# Altium footprint library TYCO THD.PcbLib: 146 footprints (part 3 of 11) (continued)
## TYCO_2-1761606-5 [mm] "14 Contacts, Vertical Low Profile IDC Shrouded Header, with Long Eject Latch" (continued)
Mechanical 14:
  lines w0.1: -11.328,-4.191 -11.379,-4.191 -11.379,-4.369 -12.7,-4.369 -12.7,4.826 -11.379,4.826 -11.379,4.369 11.379,4.369 11.379,4.826 12.7,4.826 12.7,-4.369 11.379,-4.369 11.379,-4.191 11.328,-4.191 ; -11.328,-3.581 -11.76,-3.581 ; -11.328,-3.2 -11.379,-3.2 ; -11.328,0.33 -9.881,0.33 -9.881,-5.588 ; -9.881,-4.191 -8.636,-4.191 -8.636,-4.369 4.204,-4.369 4.204,-3.886 8.496,-3.886 8.496,-4.369 8.636,-4.369 8.636,-4.191 9.881,-4.191 ; -9.881,-3.581 -2.921,-3.581 ; -9.881,-3.2 9.881,-3.2 ; -8.687,-4.191 -8.687,-5.588 -11.328,-5.588 -11.328,3.226 -8.687,3.226 -8.687,-3.2 ; -8.636,-3.2 -8.636,3.81 -11.76,3.81 ; -8.636,3.2 8.636,3.2 ; -8.636,3.429 -11.379,3.429 ; -8.636,3.581 8.636,3.581 ; -7.874,-4.369 -7.874,-4.191 -6.35,-4.191 -6.35,-4.369 ; -2.921,-4.369 -2.921,-3.581 ; -2.54,-4.369 -2.54,-3.2 -2.921,-3.581 ; 2.54,-4.369 2.54,-3.2 2.921,-3.581 ; 2.921,-4.369 2.921,-3.581 ; 5.156,-3.886 5.156,-3.2 ; 5.156,-3.581 2.921,-3.581 ; 5.156,-3.454 7.264,-3.454 ; 7.264,-3.886 7.264,-3.2 ; 7.264,-3.581 9.881,-3.581 ; 8.636,-3.2 8.636,3.81 11.76,3.81 ; 8.636,3.429 11.379,3.429 ; 8.687,-4.191 8.687,-5.588 11.328,-5.588 11.328,3.226 8.687,3.226 8.687,-3.2 ; 9.881,-5.588 9.881,0.33 11.328,0.33 ; 11.328,-3.581 11.76,-3.581 ; 11.328,-3.2 11.379,-3.2 ; -11.76,-3.581 -11.379,-3.2 ; -11.76,-3.581 -11.76,3.81 ; -11.76,3.81 -11.379,3.429 ; -11.379,-3.2 -11.379,3.429 ; 11.379,-3.2 11.379,3.429 ; 11.379,-3.2 11.76,-3.581 ; 11.379,3.429 11.76,3.81 ; 11.76,-3.581 11.76,3.81 ; -7.938,-1.587 -7.938,-0.953 -7.302,-0.953 -7.302,-1.587 -7.938,-1.587 ; -7.938,0.953 -7.302,0.953 -7.302,1.587 -7.938,1.587 -7.938,0.953 ; -5.397,-1.587 -5.397,-0.953 -4.763,-0.953 -4.763,-1.587 -5.397,-1.587 ; -5.397,0.953 -4.763,0.953 -4.763,1.587 -5.397,1.587 -5.397,0.953 ; -2.857,-1.587 -2.857,-0.953 -2.222,-0.953 -2.222,-1.587 -2.857,-1.587 ; -2.857,0.953 -2.222,0.953 -2.222,1.587 -2.857,1.587 -2.857,0.953 ; -0.318,-1.587 -0.318,-0.953 0.318,-0.953 0.318,-1.587 -0.318,-1.587 ; -0.318,0.953 0.318,0.953 0.318,1.587 -0.318,1.587 -0.318,0.953 ; 2.222,-1.587 2.222,-0.953 2.857,-0.953 2.857,-1.587 2.222,-1.587 ; 2.222,0.953 2.857,0.953 2.857,1.587 2.222,1.587 2.222,0.953 ; 4.763,-1.587 4.763,-0.953 5.397,-0.953 5.397,-1.587 4.763,-1.587 ; 4.763,0.953 5.397,0.953 5.397,1.587 4.763,1.587 4.763,0.953 ; 7.302,-1.587 7.302,-0.953 7.938,-0.953 7.938,-1.587 7.302,-1.587 ; 7.302,0.953 7.938,0.953 7.938,1.587 7.302,1.587 7.302,0.953
3D body "TYCO_2-1761606-5.stp": height 22.55, standoff -2.59, extent -12.7,-5.588 12.7,4.826

## TYCO_2-1761606-6 [mm] "16 Contacts, Vertical Low Profile IDC Shrouded Header, with Long Eject Latch"
height 22.86
pads (16):
  round 1.6 hole 0.9: 1(-8.89,-1.27) 2(-8.89,1.27) 3(-6.35,-1.27) 4(-6.35,1.27) 5(-3.81,-1.27) 6(-3.81,1.27) 7(-1.27,-1.27) 8(-1.27,1.27) 9(1.27,-1.27) 10(1.27,1.27) 11(3.81,-1.27) 12(3.81,1.27) 13(6.35,-1.27) 14(6.35,1.27) 15(8.89,-1.27) 16(8.89,1.27)
Top Overlay:
  circle w0.3: c-7.62,-5.08 r0.15
  lines w0.2: -12.598,-4.191 -12.649,-4.191 -12.649,-4.369 -13.97,-4.369 -13.97,4.826 -12.649,4.826 -12.649,4.369 12.649,4.369 12.649,4.826 13.97,4.826 13.97,-4.369 12.649,-4.369 12.649,-4.191 12.598,-4.191 ; -12.598,-3.581 -13.03,-3.581 ; -12.598,-3.2 -12.649,-3.2 ; -12.598,0.33 -11.151,0.33 -11.151,-5.588 ; -11.151,-4.191 -9.906,-4.191 -9.906,-4.369 4.204,-4.369 4.204,-3.886 9.766,-3.886 9.766,-4.369 9.906,-4.369 9.906,-4.191 11.151,-4.191 ; -11.151,-3.581 -2.921,-3.581 ; -11.151,-3.2 11.151,-3.2 ; -9.957,-4.191 -9.957,-5.588 -12.598,-5.588 -12.598,3.226 -9.957,3.226 -9.957,1.699 ; -9.957,-3.2 -9.957,-1.699 ; -9.957,-0.841 -9.957,0.841 ; -9.906,-3.2 -9.906,-1.809 ; -9.906,-0.731 -9.906,0.731 ; -9.906,1.809 -9.906,3.81 -13.03,3.81 ; -9.906,3.2 9.906,3.2 ; -9.906,3.429 -12.649,3.429 ; -9.906,3.581 9.906,3.581 ; -7.874,-4.369 -7.874,-4.191 -6.35,-4.191 -6.35,-4.369 ; -2.921,-4.369 -2.921,-3.581 ; -2.54,-4.369 -2.54,-3.2 -2.921,-3.581 ; 2.54,-4.369 2.54,-3.2 2.921,-3.581 ; 2.921,-4.369 2.921,-3.581 ; 5.156,-3.886 5.156,-3.2 ; 5.156,-3.581 2.921,-3.581 ; 5.156,-3.454 7.264,-3.454 ; 7.264,-3.886 7.264,-3.2 ; 7.264,-3.581 11.151,-3.581 ; 9.906,-3.2 9.906,-1.809 ; 9.906,-0.731 9.906,0.731 ; 9.906,1.809 9.906,3.81 13.03,3.81 ; 9.906,3.429 12.649,3.429 ; 9.957,-4.191 9.957,-5.588 12.598,-5.588 12.598,3.226 9.957,3.226 9.957,1.699 ; 9.957,-3.2 9.957,-1.699 ; 9.957,-0.841 9.957,0.841 ; 11.151,-5.588 11.151,0.33 12.598,0.33 ; 12.598,-3.581 13.03,-3.581 ; 12.598,-3.2 12.649,-3.2 ; -13.03,-3.581 -13.03,3.81 ; -13.03,-3.581 -12.649,-3.2 ; -13.03,3.81 -12.649,3.429 ; -12.649,-3.2 -12.649,3.429 ; 12.649,-3.2 13.03,-3.581 ; 12.649,-3.2 12.649,3.429 ; 12.649,3.429 13.03,3.81 ; 13.03,-3.581 13.03,3.81
Mechanical 8:
  lines w0.1: -9.39,-1.27 -8.89,-1.27 ; -9.39,1.27 -8.89,1.27 ; -8.89,-1.77 -8.89,-1.27 ; -8.89,-0.77 -8.89,-1.27 ; -8.89,0.77 -8.89,1.27 ; -8.89,1.77 -8.89,1.27 ; -8.39,-1.27 -8.89,-1.27 ; -8.39,1.27 -8.89,1.27 ; -6.85,-1.27 -6.35,-1.27 ; -6.85,1.27 -6.35,1.27 ; -6.35,-1.77 -6.35,-1.27 ; -6.35,-0.77 -6.35,-1.27 ; -6.35,0.77 -6.35,1.27 ; -6.35,1.77 -6.35,1.27 ; -5.85,-1.27 -6.35,-1.27 ; -5.85,1.27 -6.35,1.27 ; -4.31,-1.27 -3.81,-1.27 ; -4.31,1.27 -3.81,1.27 ; -3.81,-1.77 -3.81,-1.27 ; -3.81,-0.77 -3.81,-1.27 ; -3.81,0.77 -3.81,1.27 ; -3.81,1.77 -3.81,1.27 ; -3.31,-1.27 -3.81,-1.27 ; -3.31,1.27 -3.81,1.27 ; -1.77,-1.27 -1.27,-1.27 ; -1.77,1.27 -1.27,1.27 ; -1.27,-1.77 -1.27,-1.27 ; -1.27,-0.77 -1.27,-1.27 ; -1.27,0.77 -1.27,1.27 ; -1.27,1.77 -1.27,1.27 ; -0.77,-1.27 -1.27,-1.27 ; -0.77,1.27 -1.27,1.27 ; -0.5,0 0,0 ; 0,-0.5 0,0 ; 0,0.5 0,0 ; 0.5,0 0,0 ; 0.77,-1.27 1.27,-1.27 ; 0.77,1.27 1.27,1.27 ; 1.27,-1.77 1.27,-1.27 ; 1.27,-0.77 1.27,-1.27 ; 1.27,0.77 1.27,1.27 ; 1.27,1.77 1.27,1.27 ; 1.77,-1.27 1.27,-1.27 ; 1.77,1.27 1.27,1.27 ; 3.31,-1.27 3.81,-1.27 ; 3.31,1.27 3.81,1.27 ; 3.81,-1.77 3.81,-1.27 ; 3.81,-0.77 3.81,-1.27 ; 3.81,0.77 3.81,1.27 ; 3.81,1.77 3.81,1.27 ; 4.31,-1.27 3.81,-1.27 ; 4.31,1.27 3.81,1.27 ; 5.85,-1.27 6.35,-1.27 ; 5.85,1.27 6.35,1.27 ; 6.35,-1.77 6.35,-1.27 ; 6.35,-0.77 6.35,-1.27 ; 6.35,0.77 6.35,1.27 ; 6.35,1.77 6.35,1.27 ; 6.85,-1.27 6.35,-1.27 ; 6.85,1.27 6.35,1.27 ; 8.39,-1.27 8.89,-1.27 ; 8.39,1.27 8.89,1.27 ; 8.89,-1.77 8.89,-1.27 ; 8.89,-0.77 8.89,-1.27 ; 8.89,0.77 8.89,1.27 ; 8.89,1.77 8.89,1.27 ; 9.39,-1.27 8.89,-1.27 ; 9.39,1.27 8.89,1.27
Mechanical 14:
  lines w0.1: -12.598,-4.191 -12.649,-4.191 -12.649,-4.369 -13.97,-4.369 -13.97,4.826 -12.649,4.826 -12.649,4.369 12.649,4.369 12.649,4.826 13.97,4.826 13.97,-4.369 12.649,-4.369 12.649,-4.191 12.598,-4.191 ; -12.598,-3.581 -13.03,-3.581 ; -12.598,-3.2 -12.649,-3.2 ; -12.598,0.33 -11.151,0.33 -11.151,-5.588 ; -11.151,-4.191 -9.906,-4.191 -9.906,-4.369 4.204,-4.369 4.204,-3.886 9.766,-3.886 9.766,-4.369 9.906,-4.369 9.906,-4.191 11.151,-4.191 ; -11.151,-3.581 -2.921,-3.581 ; -11.151,-3.2 11.151,-3.2 ; -9.957,-4.191 -9.957,-5.588 -12.598,-5.588 -12.598,3.226 -9.957,3.226 -9.957,-3.2 ; -9.906,-3.2 -9.906,3.81 -13.03,3.81 ; -9.906,3.2 9.906,3.2 ; -9.906,3.429 -12.649,3.429 ; -9.906,3.581 9.906,3.581 ; -7.874,-4.369 -7.874,-4.191 -6.35,-4.191 -6.35,-4.369 ; -2.921,-4.369 -2.921,-3.581 ; -2.54,-4.369 -2.54,-3.2 -2.921,-3.581 ; 2.54,-4.369 2.54,-3.2 2.921,-3.581 ; 2.921,-4.369 2.921,-3.581 ; 5.156,-3.886 5.156,-3.2 ; 5.156,-3.581 2.921,-3.581 ; 5.156,-3.454 7.264,-3.454 ; 7.264,-3.886 7.264,-3.2 ; 7.264,-3.581 11.151,-3.581 ; 9.906,-3.2 9.906,3.81 13.03,3.81 ; 9.906,3.429 12.649,3.429 ; 9.957,-4.191 9.957,-5.588 12.598,-5.588 12.598,3.226 9.957,3.226 9.957,-3.2 ; 11.151,-5.588 11.151,0.33 12.598,0.33 ; 12.598,-3.581 13.03,-3.581 ; 12.598,-3.2 12.649,-3.2 ; -13.03,-3.581 -13.03,3.81 ; -13.03,-3.581 -12.649,-3.2 ; -13.03,3.81 -12.649,3.429 ; -12.649,-3.2 -12.649,3.429 ; 12.649,-3.2 13.03,-3.581 ; 12.649,-3.2 12.649,3.429 ; 12.649,3.429 13.03,3.81 ; 13.03,-3.581 13.03,3.81 ; -9.207,-1.587 -8.572,-1.587 -8.572,-0.953 -9.207,-0.953 -9.207,-1.587 ; -9.207,0.953 -9.207,1.587 -8.572,1.587 -8.572,0.953 -9.207,0.953 ; -6.667,-1.587 -6.032,-1.587 -6.032,-0.953 -6.667,-0.953 -6.667,-1.587 ; -6.667,0.953 -6.667,1.587 -6.032,1.587 -6.032,0.953 -6.667,0.953 ; -4.127,-1.587 -3.492,-1.587 -3.492,-0.953 -4.127,-0.953 -4.127,-1.587 ; -4.127,0.953 -4.127,1.587 -3.492,1.587 -3.492,0.953 -4.127,0.953 ; -1.587,-1.587 -0.953,-1.587 -0.953,-0.953 -1.587,-0.953 -1.587,-1.587 ; -1.587,0.953 -1.587,1.587 -0.953,1.587 -0.953,0.953 -1.587,0.953 ; 0.953,-1.587 1.587,-1.587 1.587,-0.953 0.953,-0.953 0.953,-1.587 ; 0.953,0.953 0.953,1.587 1.587,1.587 1.587,0.953 0.953,0.953 ; 3.492,-1.587 4.127,-1.587 4.127,-0.953 3.492,-0.953 3.492,-1.587 ; 3.492,0.953 3.492,1.587 4.127,1.587 4.127,0.953 3.492,0.953 ; 6.032,-1.587 6.667,-1.587 6.667,-0.953 6.032,-0.953 6.032,-1.587 ; 6.032,0.953 6.032,1.587 6.667,1.587 6.667,0.953 6.032,0.953 ; 8.572,-1.587 9.207,-1.587 9.207,-0.953 8.572,-0.953 8.572,-1.587 ; 8.572,0.953 8.572,1.587 9.207,1.587 9.207,0.953 8.572,0.953
3D body "TYCO_2-1761606-6.stp": height 22.55, standoff -2.59, extent -13.97,-5.588 13.97,4.826

## TYCO_2-1761606-7 [mm] "20 Contacts, Vertical Low Profile IDC Shrouded Header, with Long Eject Latch"
height 22.86
pads (20):
  round 1.6 hole 0.9: 1(-11.43,-1.27) 2(-11.43,1.27) 3(-8.89,-1.27) 4(-8.89,1.27) 5(-6.35,-1.27) 6(-6.35,1.27) 7(-3.81,-1.27) 8(-3.81,1.27) 9(-1.27,-1.27) 10(-1.27,1.27) 11(1.27,-1.27) 12(1.27,1.27) 13(3.81,-1.27) 14(3.81,1.27) 15(6.35,-1.27) 16(6.35,1.27) 17(8.89,-1.27) 18(8.89,1.27) 19(11.43,-1.27) 20(11.43,1.27)
Top Overlay:
  circle w0.3: c-11.43,-5.08 r0.15
  lines w0.2: -15.189,-1.714 -15.138,-1.714 ; -15.189,0.559 -15.138,0.559 ; -15.138,-5.565 -13.691,-5.565 ; -15.138,-4.191 -15.189,-4.191 -15.189,-4.369 -16.51,-4.369 -16.51,4.826 -15.189,4.826 -15.189,4.369 -1.27,4.369 -1.27,4.826 1.27,4.826 1.27,4.369 15.189,4.369 15.189,4.826 16.51,4.826 16.51,-4.369 15.189,-4.369 15.189,-4.191 15.138,-4.191 ; -15.138,-3.581 -15.57,-3.581 ; -15.138,-3.2 -15.189,-3.2 ; -15.138,0.33 -13.691,0.33 -13.691,-5.588 ; -15.138,3.219 -12.497,3.219 ; -13.691,-4.191 -12.446,-4.191 -12.446,-4.369 -9.627,-4.369 -9.627,-3.886 -5.613,-3.886 -5.613,-4.369 8.014,-4.369 8.014,-3.886 12.306,-3.886 12.306,-4.369 12.446,-4.369 12.446,-4.191 13.691,-4.191 ; -13.691,-3.581 -8.674,-3.581 ; -13.691,-3.2 13.691,-3.2 ; -12.675,-5.588 -12.675,-4.191 ; -12.497,-4.191 -12.497,-5.588 -15.138,-5.588 -15.138,3.226 -12.497,3.226 -12.497,1.699 ; -12.497,-3.2 -12.497,-1.7 ; -12.497,-0.841 -12.497,0.84 ; -12.446,-3.2 -12.446,-1.809 ; -12.446,-0.731 -12.446,0.731 ; -12.446,1.809 -12.446,3.81 -15.57,3.81 ; -12.446,3.2 12.446,3.2 ; -12.446,3.429 -15.189,3.429 ; -12.446,3.581 12.446,3.581 ; -11.684,-4.369 -11.684,-4.191 -10.16,-4.191 -10.16,-4.369 ; -10.922,-4.369 -10.922,-4.191 ; -8.674,-3.886 -8.674,-3.2 ; -8.674,-3.454 -6.566,-3.454 ; -6.566,-3.886 -6.566,-3.2 ; -6.566,-3.581 -2.921,-3.581 ; -2.921,-4.369 -2.921,-3.581 ; -2.54,-4.369 -2.54,-3.2 -2.921,-3.581 ; 2.54,-4.369 2.54,-3.2 2.921,-3.581 ; 2.921,-4.369 2.921,-3.581 ; 8.966,-3.886 8.966,-3.2 ; 8.966,-3.581 2.921,-3.581 ; 8.966,-3.454 11.074,-3.454 ; 11.074,-3.886 11.074,-3.2 ; 11.074,-3.581 13.691,-3.581 ; 12.446,-3.2 12.446,-1.809 ; 12.446,-0.731 12.446,0.731 ; 12.446,1.809 12.446,3.81 15.57,3.81 ; 12.446,3.429 15.189,3.429 ; 12.497,-4.191 12.497,-5.588 15.138,-5.588 15.138,3.226 12.497,3.226 12.497,1.699 ; 12.497,-3.2 12.497,-1.7 ; 12.497,-0.841 12.497,0.84 ; 12.497,3.219 15.138,3.219 ; 12.675,-5.588 12.675,-4.191 ; 13.691,-5.588 13.691,0.33 15.138,0.33 ; 13.691,-5.565 15.138,-5.565 ; 15.138,-3.581 15.57,-3.581 ; 15.138,-3.2 15.189,-3.2 ; 15.138,-1.714 15.189,-1.714 ; 15.138,0.559 15.189,0.559 ; -15.57,-3.581 -15.57,3.81 ; -15.57,-3.581 -15.189,-3.2 ; -15.57,3.81 -15.189,3.429 ; -15.189,-3.2 -15.189,3.429 ; 15.189,-3.2 15.57,-3.581 ; 15.189,-3.2 15.189,3.429 ; 15.189,3.429 15.57,3.81 ; 15.57,-3.581 15.57,3.81
Mechanical 8:
  lines w0.05: -11.93,-1.27 -11.43,-1.27 ; -11.93,1.27 -11.43,1.27 ; -11.43,-1.77 -11.43,-1.27 ; -11.43,-0.77 -11.43,-1.27 ; -11.43,0.77 -11.43,1.27 ; -11.43,1.77 -11.43,1.27 ; -10.93,-1.27 -11.43,-1.27 ; -10.93,1.27 -11.43,1.27 ; -9.39,-1.27 -8.89,-1.27 ; -9.39,1.27 -8.89,1.27 ; -8.89,-1.77 -8.89,-1.27 ; -8.89,-0.77 -8.89,-1.27 ; -8.89,0.77 -8.89,1.27 ; -8.89,1.77 -8.89,1.27 ; -8.39,-1.27 -8.89,-1.27 ; -8.39,1.27 -8.89,1.27 ; -6.85,-1.27 -6.35,-1.27 ; -6.85,1.27 -6.35,1.27 ; -6.35,-1.77 -6.35,-1.27 ; -6.35,-0.77 -6.35,-1.27 ; -6.35,0.77 -6.35,1.27 ; -6.35,1.77 -6.35,1.27 ; -5.85,-1.27 -6.35,-1.27 ; -5.85,1.27 -6.35,1.27 ; -4.31,-1.27 -3.81,-1.27 ; -4.31,1.27 -3.81,1.27 ; -3.81,-1.77 -3.81,-1.27 ; -3.81,-0.77 -3.81,-1.27 ; -3.81,0.77 -3.81,1.27 ; -3.81,1.77 -3.81,1.27 ; -3.31,-1.27 -3.81,-1.27 ; -3.31,1.27 -3.81,1.27 ; -1.77,-1.27 -1.27,-1.27 ; -1.77,1.27 -1.27,1.27 ; -1.27,-1.77 -1.27,-1.27 ; -1.27,-0.77 -1.27,-1.27 ; -1.27,0.77 -1.27,1.27 ; -1.27,1.77 -1.27,1.27 ; -0.77,-1.27 -1.27,-1.27 ; -0.77,1.27 -1.27,1.27 ; -0.5,0 0,0 ; 0,-0.5 0,0 ; 0,0.5 0,0 ; 0.5,0 0,0 ; 0.77,-1.27 1.27,-1.27 ; 0.77,1.27 1.27,1.27 ; 1.27,-1.77 1.27,-1.27 ; 1.27,-0.77 1.27,-1.27 ; 1.27,0.77 1.27,1.27 ; 1.27,1.77 1.27,1.27 ; 1.77,-1.27 1.27,-1.27 ; 1.77,1.27 1.27,1.27 ; 3.31,-1.27 3.81,-1.27 ; 3.31,1.27 3.81,1.27 ; 3.81,-1.77 3.81,-1.27 ; 3.81,-0.77 3.81,-1.27 ; 3.81,0.77 3.81,1.27 ; 3.81,1.77 3.81,1.27 ; 4.31,-1.27 3.81,-1.27 ; 4.31,1.27 3.81,1.27 ; 5.85,-1.27 6.35,-1.27 ; 5.85,1.27 6.35,1.27 ; 6.35,-1.77 6.35,-1.27 ; 6.35,-0.77 6.35,-1.27 ; 6.35,0.77 6.35,1.27 ; 6.35,1.77 6.35,1.27 ; 6.85,-1.27 6.35,-1.27 ; 6.85,1.27 6.35,1.27 ; 8.39,-1.27 8.89,-1.27 ; 8.39,1.27 8.89,1.27 ; 8.89,-1.77 8.89,-1.27 ; 8.89,-0.77 8.89,-1.27 ; 8.89,0.77 8.89,1.27 ; 8.89,1.77 8.89,1.27 ; 9.39,-1.27 8.89,-1.27 ; 9.39,1.27 8.89,1.27 ; 10.93,-1.27 11.43,-1.27 ; 10.93,1.27 11.43,1.27 ; 11.43,-1.77 11.43,-1.27 ; 11.43,-0.77 11.43,-1.27 ; 11.43,0.77 11.43,1.27 ; 11.43,1.77 11.43,1.27 ; 11.93,-1.27 11.43,-1.27 ; 11.93,1.27 11.43,1.27
Mechanical 14:
  drawing of 179 lines, arcs and shapes, not listed
3D body "TYCO_2-1761606-7.stp": height 22.55, standoff -2.59, extent -16.51,-5.588 16.51,4.826

## TYCO_2-1761606-8 [mm] "24 Contacts, Vertical Low Profile IDC Shrouded Header, with Long Eject Latch"
height 22.86
pads (24):
  round 1.6 hole 0.9: 1(-13.97,-1.27) 2(-13.97,1.27) 3(-11.43,-1.27) 4(-11.43,1.27) 5(-8.89,-1.27) 6(-8.89,1.27) 7(-6.35,-1.27) 8(-6.35,1.27) 9(-3.81,-1.27) 10(-3.81,1.27) 11(-1.27,-1.27) 12(-1.27,1.27) 13(1.27,-1.27) 14(1.27,1.27) 15(3.81,-1.27) 16(3.81,1.27) 17(6.35,-1.27) 18(6.35,1.27) 19(8.89,-1.27) 20(8.89,1.27) 21(11.43,-1.27) 22(11.43,1.27) 23(13.97,-1.27) 24(13.97,1.27)
Top Overlay:
  circle w0.3: c-13.97,-5.08 r0.15
  lines w0.2: -17.678,-4.191 -17.729,-4.191 -17.729,-4.369 -19.05,-4.369 -19.05,4.826 -17.729,4.826 -17.729,4.369 17.729,4.369 17.729,4.826 19.05,4.826 19.05,-4.369 17.729,-4.369 17.729,-4.191 17.678,-4.191 ; -17.678,-3.581 -18.11,-3.581 ; -17.678,-3.2 -17.729,-3.2 ; -17.678,0.33 -16.231,0.33 -16.231,-5.588 ; -16.231,-4.191 -14.986,-4.191 -14.986,-4.369 4.204,-4.369 4.204,-3.886 14.846,-3.886 14.846,-4.369 14.986,-4.369 14.986,-4.191 16.231,-4.191 ; -16.231,-3.581 -2.921,-3.581 ; -16.231,-3.2 16.231,-3.2 ; -15.037,-4.191 -15.037,-5.588 -17.678,-5.588 -17.678,3.226 -15.037,3.226 -15.037,1.699 ; -15.037,-3.2 -15.037,-1.699 ; -15.037,-0.841 -15.037,0.841 ; -14.986,-3.2 -14.986,-1.809 ; -14.986,-0.731 -14.986,0.731 ; -14.986,1.809 -14.986,3.81 -18.11,3.81 ; -14.986,3.2 14.986,3.2 ; -14.986,3.429 -17.729,3.429 ; -14.986,3.581 14.986,3.581 ; -14.224,-4.369 -14.224,-4.191 -12.7,-4.191 -12.7,-4.369 ; -2.921,-4.369 -2.921,-3.581 ; -2.54,-4.369 -2.54,-3.2 -2.921,-3.581 ; 2.54,-4.369 2.54,-3.2 2.921,-3.581 ; 2.921,-4.369 2.921,-3.581 ; 5.156,-3.886 5.156,-3.2 ; 5.156,-3.581 2.921,-3.581 ; 5.156,-3.454 7.264,-3.454 ; 7.264,-3.886 7.264,-3.2 ; 7.264,-3.581 16.231,-3.581 ; 14.986,-3.2 14.986,-1.809 ; 14.986,-0.731 14.986,0.731 ; 14.986,1.809 14.986,3.81 18.11,3.81 ; 14.986,3.429 17.729,3.429 ; 15.037,-4.191 15.037,-5.588 17.678,-5.588 17.678,3.226 15.037,3.226 15.037,1.699 ; 15.037,-3.2 15.037,-1.699 ; 15.037,-0.841 15.037,0.841 ; 16.231,-5.588 16.231,0.33 17.678,0.33 ; 17.678,-3.581 18.11,-3.581 ; 17.678,-3.2 17.729,-3.2 ; -18.11,-3.581 -17.729,-3.2 ; -18.11,-3.581 -18.11,3.81 ; -18.11,3.81 -17.729,3.429 ; -17.729,-3.2 -17.729,3.429 ; 17.729,-3.2 17.729,3.429 ; 17.729,-3.2 18.11,-3.581 ; 17.729,3.429 18.11,3.81 ; 18.11,-3.581 18.11,3.81
Mechanical 8:
  lines w0.1: -14.47,-1.27 -13.97,-1.27 ; -14.47,1.27 -13.97,1.27 ; -13.97,-1.77 -13.97,-1.27 ; -13.97,-0.77 -13.97,-1.27 ; -13.97,0.77 -13.97,1.27 ; -13.97,1.77 -13.97,1.27 ; -13.47,-1.27 -13.97,-1.27 ; -13.47,1.27 -13.97,1.27 ; -11.93,-1.27 -11.43,-1.27 ; -11.93,1.27 -11.43,1.27 ; -11.43,-1.77 -11.43,-1.27 ; -11.43,-0.77 -11.43,-1.27 ; -11.43,0.77 -11.43,1.27 ; -11.43,1.77 -11.43,1.27 ; -10.93,-1.27 -11.43,-1.27 ; -10.93,1.27 -11.43,1.27 ; -9.39,-1.27 -8.89,-1.27 ; -9.39,1.27 -8.89,1.27 ; -8.89,-1.77 -8.89,-1.27 ; -8.89,-0.77 -8.89,-1.27 ; -8.89,0.77 -8.89,1.27 ; -8.89,1.77 -8.89,1.27 ; -8.39,-1.27 -8.89,-1.27 ; -8.39,1.27 -8.89,1.27 ; -6.85,-1.27 -6.35,-1.27 ; -6.85,1.27 -6.35,1.27 ; -6.35,-1.77 -6.35,-1.27 ; -6.35,-0.77 -6.35,-1.27 ; -6.35,0.77 -6.35,1.27 ; -6.35,1.77 -6.35,1.27 ; -5.85,-1.27 -6.35,-1.27 ; -5.85,1.27 -6.35,1.27 ; -4.31,-1.27 -3.81,-1.27 ; -4.31,1.27 -3.81,1.27 ; -3.81,-1.77 -3.81,-1.27 ; -3.81,-0.77 -3.81,-1.27 ; -3.81,0.77 -3.81,1.27 ; -3.81,1.77 -3.81,1.27 ; -3.31,-1.27 -3.81,-1.27 ; -3.31,1.27 -3.81,1.27 ; -1.77,-1.27 -1.27,-1.27 ; -1.77,1.27 -1.27,1.27 ; -1.27,-1.77 -1.27,-1.27 ; -1.27,-0.77 -1.27,-1.27 ; -1.27,0.77 -1.27,1.27 ; -1.27,1.77 -1.27,1.27 ; -0.77,-1.27 -1.27,-1.27 ; -0.77,1.27 -1.27,1.27 ; 0.77,-1.27 1.27,-1.27 ; 0.77,1.27 1.27,1.27 ; 1.27,-1.77 1.27,-1.27 ; 1.27,-0.77 1.27,-1.27 ; 1.27,0.77 1.27,1.27 ; 1.27,1.77 1.27,1.27 ; 1.77,-1.27 1.27,-1.27 ; 1.77,1.27 1.27,1.27 ; 3.31,-1.27 3.81,-1.27 ; 3.31,1.27 3.81,1.27 ; 3.81,-1.77 3.81,-1.27 ; 3.81,-0.77 3.81,-1.27 ; 3.81,0.77 3.81,1.27 ; 3.81,1.77 3.81,1.27 ; 4.31,-1.27 3.81,-1.27 ; 4.31,1.27 3.81,1.27 ; 5.85,-1.27 6.35,-1.27 ; 5.85,1.27 6.35,1.27 ; 6.35,-1.77 6.35,-1.27 ; 6.35,-0.77 6.35,-1.27 ; 6.35,0.77 6.35,1.27 ; 6.35,1.77 6.35,1.27 ; 6.85,-1.27 6.35,-1.27 ; 6.85,1.27 6.35,1.27 ; 8.39,-1.27 8.89,-1.27 ; 8.39,1.27 8.89,1.27 ; 8.89,-1.77 8.89,-1.27 ; 8.89,-0.77 8.89,-1.27 ; 8.89,0.77 8.89,1.27 ; 8.89,1.77 8.89,1.27 ; 9.39,-1.27 8.89,-1.27 ; 9.39,1.27 8.89,1.27 ; 10.93,-1.27 11.43,-1.27 ; 10.93,1.27 11.43,1.27 ; 11.43,-1.77 11.43,-1.27 ; 11.43,-0.77 11.43,-1.27 ; 11.43,0.77 11.43,1.27 ; 11.43,1.77 11.43,1.27 ; 11.93,-1.27 11.43,-1.27 ; 11.93,1.27 11.43,1.27 ; 13.47,-1.27 13.97,-1.27 ; 13.47,1.27 13.97,1.27 ; 13.97,-1.77 13.97,-1.27 ; 13.97,-0.77 13.97,-1.27 ; 13.97,0.77 13.97,1.27 ; 13.97,1.77 13.97,1.27 ; 14.47,-1.27 13.97,-1.27 ; 14.47,1.27 13.97,1.27 ; 0,0 -0.5,0 0,0 ; 0,0 0,0.5 0,0 ; 0,0 0,-0.5 0,0 ; 0,0 0.5,0 0,0
Mechanical 14:
  drawing of 168 lines, arcs and shapes, not listed
3D body "TYCO_2-1761606-8.stp": height 22.55, standoff -2.59, extent -19.05,-5.588 19.05,4.826

## TYCO_2-1761606-9 [mm] "26 Contacts, Vertical Low Profile IDC Shrouded Header, with Long Eject Latch"
height 22.86
pads (26):
  round 1.6 hole 0.9: 1(-15.24,-1.27) 2(-15.24,1.27) 3(-12.7,-1.27) 4(-12.7,1.27) 5(-10.16,-1.27) 6(-10.16,1.27) 7(-7.62,-1.27) 8(-7.62,1.27) 9(-5.08,-1.27) 10(-5.08,1.27) 11(-2.54,-1.27) 12(-2.54,1.27) 13(0,-1.27) 14(0,1.27) 15(2.54,-1.27) 16(2.54,1.27) 17(5.08,-1.27) 18(5.08,1.27) 19(7.62,-1.27) 20(7.62,1.27) 21(10.16,-1.27) 22(10.16,1.27) 23(12.7,-1.27) 24(12.7,1.27) 25(15.24,-1.27) 26(15.24,1.27)
Top Overlay:
  circle w0.3: c-15.24,-5.08 r0.15
  lines w0.2: -18.948,-4.191 -18.999,-4.191 -18.999,-4.369 -20.32,-4.369 -20.32,4.826 -18.999,4.826 -18.999,4.369 18.999,4.369 18.999,4.826 20.32,4.826 20.32,-4.369 18.999,-4.369 18.999,-4.191 18.948,-4.191 ; -18.948,-3.581 -19.38,-3.581 ; -18.948,-3.2 -18.999,-3.2 ; -18.948,0.33 -17.501,0.33 -17.501,-5.588 ; -17.501,-4.191 -16.256,-4.191 -16.256,-4.369 4.204,-4.369 4.204,-3.886 16.116,-3.886 16.116,-4.369 16.256,-4.369 16.256,-4.191 17.501,-4.191 ; -17.501,-3.581 -2.921,-3.581 ; -17.501,-3.2 17.501,-3.2 ; -16.307,-4.191 -16.307,-5.588 -18.948,-5.588 -18.948,3.226 -16.307,3.226 -16.307,1.699 ; -16.307,-3.2 -16.307,-1.699 ; -16.307,-0.841 -16.307,0.841 ; -16.256,-3.2 -16.256,-1.809 ; -16.256,-0.731 -16.256,0.731 ; -16.256,1.809 -16.256,3.81 -19.38,3.81 ; -16.256,3.2 16.256,3.2 ; -16.256,3.429 -18.999,3.429 ; -16.256,3.581 16.256,3.581 ; -15.494,-4.369 -15.494,-4.191 -13.97,-4.191 -13.97,-4.369 ; -2.921,-4.369 -2.921,-3.581 ; -2.54,-4.369 -2.54,-3.2 -2.921,-3.581 ; 2.54,-4.369 2.54,-3.2 2.921,-3.581 ; 2.921,-4.369 2.921,-3.581 ; 5.156,-3.886 5.156,-3.2 ; 5.156,-3.581 2.921,-3.581 ; 5.156,-3.454 7.264,-3.454 ; 7.264,-3.886 7.264,-3.2 ; 7.264,-3.581 17.501,-3.581 ; 16.256,-3.2 16.256,-1.809 ; 16.256,-0.731 16.256,0.731 ; 16.256,1.809 16.256,3.81 19.38,3.81 ; 16.256,3.429 18.999,3.429 ; 16.307,-4.191 16.307,-5.588 18.948,-5.588 18.948,3.226 16.307,3.226 16.307,1.699 ; 16.307,-3.2 16.307,-1.699 ; 16.307,-0.841 16.307,0.841 ; 17.501,-5.588 17.501,0.33 18.948,0.33 ; 18.948,-3.581 19.38,-3.581 ; 18.948,-3.2 18.999,-3.2 ; -19.38,-3.581 -18.999,-3.2 ; -19.38,-3.581 -19.38,3.81 ; -19.38,3.81 -18.999,3.429 ; -18.999,-3.2 -18.999,3.429 ; 18.999,-3.2 18.999,3.429 ; 18.999,-3.2 19.38,-3.581 ; 18.999,3.429 19.38,3.81 ; 19.38,-3.581 19.38,3.81
Mechanical 8:
  lines w0.1: -15.74,-1.27 -15.24,-1.27 ; -15.74,1.27 -15.24,1.27 ; -15.24,-1.77 -15.24,-1.27 ; -15.24,-0.77 -15.24,-1.27 ; -15.24,0.77 -15.24,1.27 ; -15.24,1.77 -15.24,1.27 ; -14.74,-1.27 -15.24,-1.27 ; -14.74,1.27 -15.24,1.27 ; -13.2,-1.27 -12.7,-1.27 ; -13.2,1.27 -12.7,1.27 ; -12.7,-1.77 -12.7,-1.27 ; -12.7,-0.77 -12.7,-1.27 ; -12.7,0.77 -12.7,1.27 ; -12.7,1.77 -12.7,1.27 ; -12.2,-1.27 -12.7,-1.27 ; -12.2,1.27 -12.7,1.27 ; -10.66,-1.27 -10.16,-1.27 ; -10.66,1.27 -10.16,1.27 ; -10.16,-1.77 -10.16,-1.27 ; -10.16,-0.77 -10.16,-1.27 ; -10.16,0.77 -10.16,1.27 ; -10.16,1.77 -10.16,1.27 ; -9.66,-1.27 -10.16,-1.27 ; -9.66,1.27 -10.16,1.27 ; -8.12,-1.27 -7.62,-1.27 ; -8.12,1.27 -7.62,1.27 ; -7.62,-1.77 -7.62,-1.27 ; -7.62,-0.77 -7.62,-1.27 ; -7.62,0.77 -7.62,1.27 ; -7.62,1.77 -7.62,1.27 ; -7.12,-1.27 -7.62,-1.27 ; -7.12,1.27 -7.62,1.27 ; -5.58,-1.27 -5.08,-1.27 ; -5.58,1.27 -5.08,1.27 ; -5.08,-1.77 -5.08,-1.27 ; -5.08,-0.77 -5.08,-1.27 ; -5.08,0.77 -5.08,1.27 ; -5.08,1.77 -5.08,1.27 ; -4.58,-1.27 -5.08,-1.27 ; -4.58,1.27 -5.08,1.27 ; -3.04,-1.27 -2.54,-1.27 ; -3.04,1.27 -2.54,1.27 ; -2.54,-1.77 -2.54,-1.27 ; -2.54,-0.77 -2.54,-1.27 ; -2.54,0.77 -2.54,1.27 ; -2.54,1.77 -2.54,1.27 ; -2.04,-1.27 -2.54,-1.27 ; -2.04,1.27 -2.54,1.27 ; -0.5,-1.27 0,-1.27 ; -0.5,0 0,0 ; -0.5,1.27 0,1.27 ; 0,-1.77 0,-1.27 ; 0,-0.77 0,-1.27 ; 0,-0.5 0,0 ; 0,0.5 0,0 ; 0,0.77 0,1.27 ; 0,1.77 0,1.27 ; 0.5,-1.27 0,-1.27 ; 0.5,0 0,0 ; 0.5,1.27 0,1.27 ; 2.04,-1.27 2.54,-1.27 ; 2.04,1.27 2.54,1.27 ; 2.54,-1.77 2.54,-1.27 ; 2.54,-0.77 2.54,-1.27 ; 2.54,0.77 2.54,1.27 ; 2.54,1.77 2.54,1.27 ; 3.04,-1.27 2.54,-1.27 ; 3.04,1.27 2.54,1.27 ; 4.58,-1.27 5.08,-1.27 ; 4.58,1.27 5.08,1.27 ; 5.08,-1.77 5.08,-1.27 ; 5.08,-0.77 5.08,-1.27 ; 5.08,0.77 5.08,1.27 ; 5.08,1.77 5.08,1.27 ; 5.58,-1.27 5.08,-1.27 ; 5.58,1.27 5.08,1.27 ; 7.12,-1.27 7.62,-1.27 ; 7.12,1.27 7.62,1.27 ; 7.62,-1.77 7.62,-1.27 ; 7.62,-0.77 7.62,-1.27 ; 7.62,0.77 7.62,1.27 ; 7.62,1.77 7.62,1.27 ; 8.12,-1.27 7.62,-1.27 ; 8.12,1.27 7.62,1.27 ; 9.66,-1.27 10.16,-1.27 ; 9.66,1.27 10.16,1.27 ; 10.16,-1.77 10.16,-1.27 ; 10.16,-0.77 10.16,-1.27 ; 10.16,0.77 10.16,1.27 ; 10.16,1.77 10.16,1.27 ; 10.66,-1.27 10.16,-1.27 ; 10.66,1.27 10.16,1.27 ; 12.2,-1.27 12.7,-1.27 ; 12.2,1.27 12.7,1.27 ; 12.7,-1.77 12.7,-1.27 ; 12.7,-0.77 12.7,-1.27 ; 12.7,0.77 12.7,1.27 ; 12.7,1.77 12.7,1.27 ; 13.2,-1.27 12.7,-1.27 ; 13.2,1.27 12.7,1.27 ; 14.74,-1.27 15.24,-1.27 ; 14.74,1.27 15.24,1.27 ; 15.24,-1.77 15.24,-1.27 ; 15.24,-0.77 15.24,-1.27 ; 15.24,0.77 15.24,1.27 ; 15.24,1.77 15.24,1.27 ; 15.74,-1.27 15.24,-1.27 ; 15.74,1.27 15.24,1.27
Mechanical 14:
  drawing of 176 lines, arcs and shapes, not listed
3D body "TYCO_2-1761606-9.stp": height 22.55, standoff -2.59, extent -20.32,-5.588 20.32,4.826